# Altium schematic symbol library jlcpcb_2025_04_resistors_extended_1210.schlib: 2670 symbols (part 5 of 14)
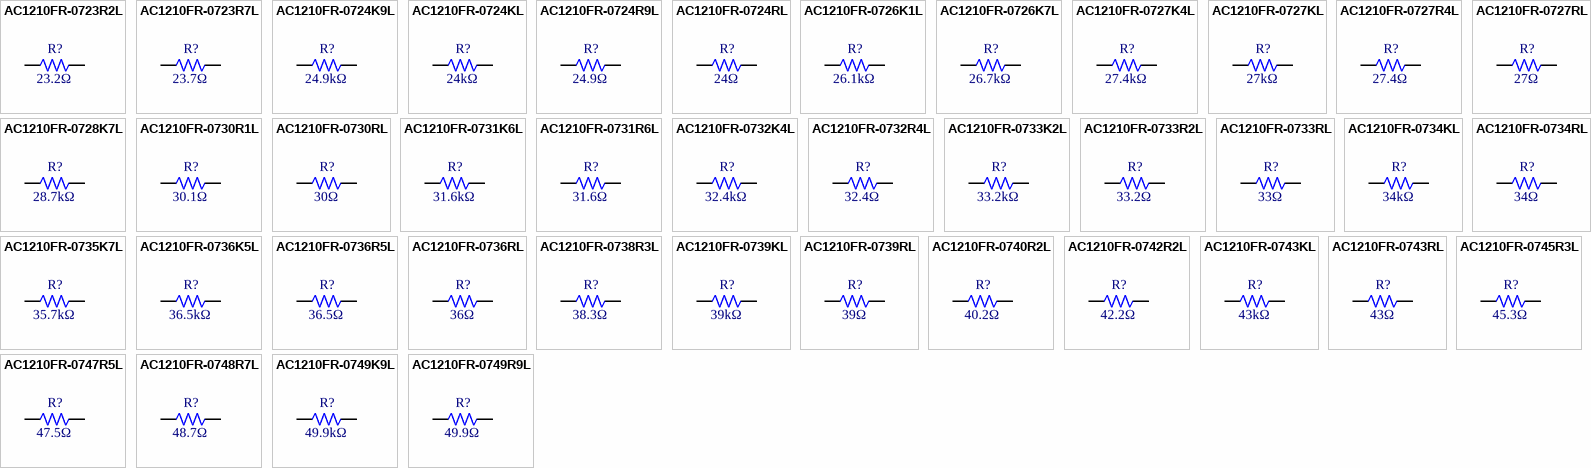
[diagram p70: symbols AC1210FR-0723R2L to AC1210FR-0749R9L]

## AC1210FR-0731K6L
designator R?  Resistance: 31.6kΩ  (hidden comment: *)
Resistor, 31.6kΩ, ±1%, 500mW, 200V, ±100ppm/℃, -55℃~+155℃, SMD 1210; Manufacturer: Uniroyal; Manufacturer Part Number: AC1210FR-0731K6L; Supplier 1: LCSC; Supplier Part Number 1: C230188; JLCPCB Part Number: C230188; Power Rating: 500mW; Category: Resistors; Package Size: 1210; JLCPCB Basic Part: Yes; Tolerance: ±1%; Voltage Rating: 200V; Temperature Coefficient: ±100ppm/℃; Temperature Rating: -55℃~+155℃; ComponentLink1Description: Datasheet; ComponentLink1URL: https://wmsc.lcsc.com/wmsc/upload/file/pdf/v2/lcsc/2304140030_YAGEO-AC1210FR-0731K6L_C230188.pdf; ComponentLink2Description: JLCPCB Part URL; ComponentLink2URL: https://jlcpcb.com/partdetail/C230188
pins: 1, 2
1 alternate drawing of the same symbol

## AC1210FR-0731R6L
designator R?  Resistance: 31.6Ω  (hidden comment: *)
Resistor, 31.6Ω, ±1%, 500mW, 200V, ±100ppm/℃, -55℃~+155℃, SMD 1210; Manufacturer: Uniroyal; Manufacturer Part Number: AC1210FR-0731R6L; Supplier 1: LCSC; Supplier Part Number 1: C230189; JLCPCB Part Number: C230189; Power Rating: 500mW; Category: Resistors; Package Size: 1210; JLCPCB Basic Part: Yes; Tolerance: ±1%; Voltage Rating: 200V; Temperature Coefficient: ±100ppm/℃; Temperature Rating: -55℃~+155℃; ComponentLink1Description: Datasheet; ComponentLink1URL: https://wmsc.lcsc.com/wmsc/upload/file/pdf/v2/lcsc/2304140030_YAGEO-AC1210FR-0731R6L_C230189.pdf; ComponentLink2Description: JLCPCB Part URL; ComponentLink2URL: https://jlcpcb.com/partdetail/C230189
pins: 1, 2
1 alternate drawing of the same symbol

## AC1210FR-0732K4L
designator R?  Resistance: 32.4kΩ  (hidden comment: *)
Resistor, 32.4kΩ, ±1%, 500mW, 200V, ±100ppm/℃, -55℃~+155℃, SMD 1210; Manufacturer: Uniroyal; Manufacturer Part Number: AC1210FR-0732K4L; Supplier 1: LCSC; Supplier Part Number 1: C230191; JLCPCB Part Number: C230191; Power Rating: 500mW; Category: Resistors; Package Size: 1210; JLCPCB Basic Part: Yes; Tolerance: ±1%; Voltage Rating: 200V; Temperature Coefficient: ±100ppm/℃; Temperature Rating: -55℃~+155℃; ComponentLink1Description: Datasheet; ComponentLink1URL: https://wmsc.lcsc.com/wmsc/upload/file/pdf/v2/lcsc/2304140030_YAGEO-AC1210FR-0732K4L_C230191.pdf; ComponentLink2Description: JLCPCB Part URL; ComponentLink2URL: https://jlcpcb.com/partdetail/C230191
pins: 1, 2
1 alternate drawing of the same symbol

## AC1210FR-0732R4L
designator R?  Resistance: 32.4Ω  (hidden comment: *)
Resistor, 32.4Ω, ±1%, 500mW, 200V, ±100ppm/℃, -55℃~+155℃, SMD 1210; Manufacturer: Uniroyal; Manufacturer Part Number: AC1210FR-0732R4L; Supplier 1: LCSC; Supplier Part Number 1: C728025; JLCPCB Part Number: C728025; Power Rating: 500mW; Category: Resistors; Package Size: 1210; JLCPCB Basic Part: Yes; Tolerance: ±1%; Voltage Rating: 200V; Temperature Coefficient: ±100ppm/℃; Temperature Rating: -55℃~+155℃; ComponentLink1Description: Datasheet; ComponentLink1URL: https://wmsc.lcsc.com/wmsc/upload/file/pdf/v2/lcsc/2304140030_YAGEO-AC1210FR-0732R4L_C728025.pdf; ComponentLink2Description: JLCPCB Part URL; ComponentLink2URL: https://jlcpcb.com/partdetail/C728025
pins: 1, 2
1 alternate drawing of the same symbol

## AC1210FR-0733K2L
designator R?  Resistance: 33.2kΩ  (hidden comment: *)
Resistor, 33.2kΩ, ±1%, 500mW, 200V, ±100ppm/℃, -55℃~+155℃, SMD 1210; Manufacturer: Uniroyal; Manufacturer Part Number: AC1210FR-0733K2L; Supplier 1: LCSC; Supplier Part Number 1: C230196; JLCPCB Part Number: C230196; Power Rating: 500mW; Category: Resistors; Package Size: 1210; JLCPCB Basic Part: Yes; Tolerance: ±1%; Voltage Rating: 200V; Temperature Coefficient: ±100ppm/℃; Temperature Rating: -55℃~+155℃; ComponentLink1Description: Datasheet; ComponentLink1URL: https://wmsc.lcsc.com/wmsc/upload/file/pdf/v2/lcsc/2304140030_YAGEO-AC1210FR-0733K2L_C230196.pdf; ComponentLink2Description: JLCPCB Part URL; ComponentLink2URL: https://jlcpcb.com/partdetail/C230196
pins: 1, 2
1 alternate drawing of the same symbol

## AC1210FR-0733R2L
designator R?  Resistance: 33.2Ω  (hidden comment: *)
Resistor, 33.2Ω, ±1%, 500mW, 200V, ±100ppm/℃, -55℃~+155℃, SMD 1210; Manufacturer: Uniroyal; Manufacturer Part Number: AC1210FR-0733R2L; Supplier 1: LCSC; Supplier Part Number 1: C910972; JLCPCB Part Number: C910972; Power Rating: 500mW; Category: Resistors; Package Size: 1210; JLCPCB Basic Part: Yes; Tolerance: ±1%; Voltage Rating: 200V; Temperature Coefficient: ±100ppm/℃; Temperature Rating: -55℃~+155℃; ComponentLink1Description: Datasheet; ComponentLink1URL: https://wmsc.lcsc.com/wmsc/upload/file/pdf/v2/lcsc/2201131300_YAGEO-AC1210FR-0733R2L_C910972.pdf; ComponentLink2Description: JLCPCB Part URL; ComponentLink2URL: https://jlcpcb.com/partdetail/C910972
pins: 1, 2
1 alternate drawing of the same symbol

## AC1210FR-0733RL
designator R?  Resistance: 33Ω  (hidden comment: *)
Resistor, 33Ω, ±1%, 500mW, 200V, ±100ppm/℃, -55℃~+155℃, SMD 1210; Manufacturer: Uniroyal; Manufacturer Part Number: AC1210FR-0733RL; Supplier 1: LCSC; Supplier Part Number 1: C230198; JLCPCB Part Number: C230198; Power Rating: 500mW; Category: Resistors; Package Size: 1210; JLCPCB Basic Part: Yes; Tolerance: ±1%; Voltage Rating: 200V; Temperature Coefficient: ±100ppm/℃; Temperature Rating: -55℃~+155℃; ComponentLink1Description: Datasheet; ComponentLink1URL: https://wmsc.lcsc.com/wmsc/upload/file/pdf/v2/lcsc/2304140030_YAGEO-AC1210FR-0733RL_C230198.pdf; ComponentLink2Description: JLCPCB Part URL; ComponentLink2URL: https://jlcpcb.com/partdetail/C230198
pins: 1, 2
1 alternate drawing of the same symbol

## AC1210FR-0734KL
designator R?  Resistance: 34kΩ  (hidden comment: *)
Resistor, 34kΩ, ±1%, 500mW, 200V, ±100ppm/℃, -55℃~+155℃, SMD 1210; Manufacturer: Uniroyal; Manufacturer Part Number: AC1210FR-0734KL; Supplier 1: LCSC; Supplier Part Number 1: C230202; JLCPCB Part Number: C230202; Power Rating: 500mW; Category: Resistors; Package Size: 1210; JLCPCB Basic Part: Yes; Tolerance: ±1%; Voltage Rating: 200V; Temperature Coefficient: ±100ppm/℃; Temperature Rating: -55℃~+155℃; ComponentLink1Description: Datasheet; ComponentLink1URL: https://wmsc.lcsc.com/wmsc/upload/file/pdf/v2/lcsc/2304140030_YAGEO-AC1210FR-0734KL_C230202.pdf; ComponentLink2Description: JLCPCB Part URL; ComponentLink2URL: https://jlcpcb.com/partdetail/C230202
pins: 1, 2
1 alternate drawing of the same symbol

## AC1210FR-0734RL
designator R?  Resistance: 34Ω  (hidden comment: *)
Resistor, 34Ω, ±1%, 500mW, 200V, ±100ppm/℃, -55℃~+155℃, SMD 1210; Manufacturer: Uniroyal; Manufacturer Part Number: AC1210FR-0734RL; Supplier 1: LCSC; Supplier Part Number 1: C230204; JLCPCB Part Number: C230204; Power Rating: 500mW; Category: Resistors; Package Size: 1210; JLCPCB Basic Part: Yes; Tolerance: ±1%; Voltage Rating: 200V; Temperature Coefficient: ±100ppm/℃; Temperature Rating: -55℃~+155℃; ComponentLink1Description: Datasheet; ComponentLink1URL: https://wmsc.lcsc.com/wmsc/upload/file/pdf/v2/lcsc/2304140030_YAGEO-AC1210FR-0734RL_C230204.pdf; ComponentLink2Description: JLCPCB Part URL; ComponentLink2URL: https://jlcpcb.com/partdetail/C230204
pins: 1, 2
1 alternate drawing of the same symbol

## AC1210FR-0735K7L
designator R?  Resistance: 35.7kΩ  (hidden comment: *)
Resistor, 35.7kΩ, ±1%, 500mW, 200V, ±100ppm/℃, -55℃~+155℃, SMD 1210; Manufacturer: Uniroyal; Manufacturer Part Number: AC1210FR-0735K7L; Supplier 1: LCSC; Supplier Part Number 1: C230206; JLCPCB Part Number: C230206; Power Rating: 500mW; Category: Resistors; Package Size: 1210; JLCPCB Basic Part: Yes; Tolerance: ±1%; Voltage Rating: 200V; Temperature Coefficient: ±100ppm/℃; Temperature Rating: -55℃~+155℃; ComponentLink1Description: Datasheet; ComponentLink1URL: https://wmsc.lcsc.com/wmsc/upload/file/pdf/v2/lcsc/2304140030_YAGEO-AC1210FR-0735K7L_C230206.pdf; ComponentLink2Description: JLCPCB Part URL; ComponentLink2URL: https://jlcpcb.com/partdetail/C230206
pins: 1, 2
1 alternate drawing of the same symbol

## AC1210FR-0736K5L
designator R?  Resistance: 36.5kΩ  (hidden comment: *)
Resistor, 36.5kΩ, ±1%, 500mW, 200V, ±100ppm/℃, -55℃~+155℃, SMD 1210; Manufacturer: Uniroyal; Manufacturer Part Number: AC1210FR-0736K5L; Supplier 1: LCSC; Supplier Part Number 1: C230211; JLCPCB Part Number: C230211; Power Rating: 500mW; Category: Resistors; Package Size: 1210; JLCPCB Basic Part: Yes; Tolerance: ±1%; Voltage Rating: 200V; Temperature Coefficient: ±100ppm/℃; Temperature Rating: -55℃~+155℃; ComponentLink1Description: Datasheet; ComponentLink1URL: https://wmsc.lcsc.com/wmsc/upload/file/pdf/v2/lcsc/2304140030_YAGEO-AC1210FR-0736K5L_C230211.pdf; ComponentLink2Description: JLCPCB Part URL; ComponentLink2URL: https://jlcpcb.com/partdetail/C230211
pins: 1, 2
1 alternate drawing of the same symbol

## AC1210FR-0736R5L
designator R?  Resistance: 36.5Ω  (hidden comment: *)
Resistor, 36.5Ω, ±1%, 500mW, ±100ppm/℃, -55℃~+155℃, SMD 1210; Manufacturer: Uniroyal; Manufacturer Part Number: AC1210FR-0736R5L; Supplier 1: LCSC; Supplier Part Number 1: C910973; JLCPCB Part Number: C910973; Power Rating: 500mW; Category: Resistors; Package Size: 1210; JLCPCB Basic Part: Yes; Tolerance: ±1%; Temperature Coefficient: ±100ppm/℃; Temperature Rating: -55℃~+155℃; ComponentLink1Description: Datasheet; ComponentLink1URL: https://wmsc.lcsc.com/wmsc/upload/file/pdf/v2/lcsc/2201131300_YAGEO-AC1210FR-0736R5L_C910973.pdf; ComponentLink2Description: JLCPCB Part URL; ComponentLink2URL: https://jlcpcb.com/partdetail/C910973
pins: 1, 2
1 alternate drawing of the same symbol

## AC1210FR-0736RL
designator R?  Resistance: 36Ω  (hidden comment: *)
Resistor, 36Ω, ±1%, 500mW, 200V, ±100ppm/℃, -55℃~+155℃, SMD 1210; Manufacturer: Uniroyal; Manufacturer Part Number: AC1210FR-0736RL; Supplier 1: LCSC; Supplier Part Number 1: C230213; JLCPCB Part Number: C230213; Power Rating: 500mW; Category: Resistors; Package Size: 1210; JLCPCB Basic Part: Yes; Tolerance: ±1%; Voltage Rating: 200V; Temperature Coefficient: ±100ppm/℃; Temperature Rating: -55℃~+155℃; ComponentLink1Description: Datasheet; ComponentLink1URL: https://wmsc.lcsc.com/wmsc/upload/file/pdf/v2/lcsc/2304140030_YAGEO-AC1210FR-0736RL_C230213.pdf; ComponentLink2Description: JLCPCB Part URL; ComponentLink2URL: https://jlcpcb.com/partdetail/C230213
pins: 1, 2
1 alternate drawing of the same symbol

## AC1210FR-0738R3L
designator R?  Resistance: 38.3Ω  (hidden comment: *)
Resistor, 38.3Ω, ±1%, 500mW, 200V, ±100ppm/℃, -55℃~+155℃, SMD 1210; Manufacturer: Uniroyal; Manufacturer Part Number: AC1210FR-0738R3L; Supplier 1: LCSC; Supplier Part Number 1: C230217; JLCPCB Part Number: C230217; Power Rating: 500mW; Category: Resistors; Package Size: 1210; JLCPCB Basic Part: Yes; Tolerance: ±1%; Voltage Rating: 200V; Temperature Coefficient: ±100ppm/℃; Temperature Rating: -55℃~+155℃; ComponentLink1Description: Datasheet; ComponentLink1URL: https://wmsc.lcsc.com/wmsc/upload/file/pdf/v2/lcsc/2304140030_YAGEO-AC1210FR-0738R3L_C230217.pdf; ComponentLink2Description: JLCPCB Part URL; ComponentLink2URL: https://jlcpcb.com/partdetail/C230217
pins: 1, 2
1 alternate drawing of the same symbol

## AC1210FR-0739KL
designator R?  Resistance: 39kΩ  (hidden comment: *)
Resistor, 39kΩ, ±1%, 500mW, 200V, ±100ppm/℃, -55℃~+155℃, SMD 1210; Manufacturer: Uniroyal; Manufacturer Part Number: AC1210FR-0739KL; Supplier 1: LCSC; Supplier Part Number 1: C230221; JLCPCB Part Number: C230221; Power Rating: 500mW; Category: Resistors; Package Size: 1210; JLCPCB Basic Part: Yes; Tolerance: ±1%; Voltage Rating: 200V; Temperature Coefficient: ±100ppm/℃; Temperature Rating: -55℃~+155℃; ComponentLink1Description: Datasheet; ComponentLink1URL: https://wmsc.lcsc.com/wmsc/upload/file/pdf/v2/lcsc/2304140030_YAGEO-AC1210FR-0739KL_C230221.pdf; ComponentLink2Description: JLCPCB Part URL; ComponentLink2URL: https://jlcpcb.com/partdetail/C230221
pins: 1, 2
1 alternate drawing of the same symbol

## AC1210FR-0739RL
designator R?  Resistance: 39Ω  (hidden comment: *)
Resistor, 39Ω, ±1%, 500mW, 200V, ±100ppm/℃, -55℃~+155℃, SMD 1210; Manufacturer: Uniroyal; Manufacturer Part Number: AC1210FR-0739RL; Supplier 1: LCSC; Supplier Part Number 1: C230223; JLCPCB Part Number: C230223; Power Rating: 500mW; Category: Resistors; Package Size: 1210; JLCPCB Basic Part: Yes; Tolerance: ±1%; Voltage Rating: 200V; Temperature Coefficient: ±100ppm/℃; Temperature Rating: -55℃~+155℃; ComponentLink1Description: Datasheet; ComponentLink1URL: https://wmsc.lcsc.com/wmsc/upload/file/pdf/v2/lcsc/2304140030_YAGEO-AC1210FR-0739RL_C230223.pdf; ComponentLink2Description: JLCPCB Part URL; ComponentLink2URL: https://jlcpcb.com/partdetail/C230223
pins: 1, 2
1 alternate drawing of the same symbol

## AC1210FR-0740R2L
designator R?  Resistance: 40.2Ω  (hidden comment: *)
Resistor, 40.2Ω, ±1%, 500mW, 200V, ±100ppm/℃, -55℃~+155℃, SMD 1210; Manufacturer: Uniroyal; Manufacturer Part Number: AC1210FR-0740R2L; Supplier 1: LCSC; Supplier Part Number 1: C230238; JLCPCB Part Number: C230238; Power Rating: 500mW; Category: Resistors; Package Size: 1210; JLCPCB Basic Part: Yes; Tolerance: ±1%; Voltage Rating: 200V; Temperature Coefficient: ±100ppm/℃; Temperature Rating: -55℃~+155℃; ComponentLink1Description: Datasheet; ComponentLink1URL: https://wmsc.lcsc.com/wmsc/upload/file/pdf/v2/lcsc/2304140030_YAGEO-AC1210FR-0740R2L_C230238.pdf; ComponentLink2Description: JLCPCB Part URL; ComponentLink2URL: https://jlcpcb.com/partdetail/C230238
pins: 1, 2
1 alternate drawing of the same symbol

## AC1210FR-0742R2L
designator R?  Resistance: 42.2Ω  (hidden comment: *)
Resistor, 42.2Ω, ±1%, 500mW, 200V, ±100ppm/℃, -55℃~+155℃, SMD 1210; Manufacturer: Uniroyal; Manufacturer Part Number: AC1210FR-0742R2L; Supplier 1: LCSC; Supplier Part Number 1: C230241; JLCPCB Part Number: C230241; Power Rating: 500mW; Category: Resistors; Package Size: 1210; JLCPCB Basic Part: Yes; Tolerance: ±1%; Voltage Rating: 200V; Temperature Coefficient: ±100ppm/℃; Temperature Rating: -55℃~+155℃; ComponentLink1Description: Datasheet; ComponentLink1URL: https://wmsc.lcsc.com/wmsc/upload/file/pdf/v2/lcsc/2304140030_YAGEO-AC1210FR-0742R2L_C230241.pdf; ComponentLink2Description: JLCPCB Part URL; ComponentLink2URL: https://jlcpcb.com/partdetail/C230241
pins: 1, 2
1 alternate drawing of the same symbol

## AC1210FR-0743KL
designator R?  Resistance: 43kΩ  (hidden comment: *)
Resistor, 43kΩ, ±1%, 500mW, 200V, ±100ppm/℃, -55℃~+155℃, SMD 1210; Manufacturer: Uniroyal; Manufacturer Part Number: AC1210FR-0743KL; Supplier 1: LCSC; Supplier Part Number 1: C230244; JLCPCB Part Number: C230244; Power Rating: 500mW; Category: Resistors; Package Size: 1210; JLCPCB Basic Part: Yes; Tolerance: ±1%; Voltage Rating: 200V; Temperature Coefficient: ±100ppm/℃; Temperature Rating: -55℃~+155℃; ComponentLink1Description: Datasheet; ComponentLink1URL: https://wmsc.lcsc.com/wmsc/upload/file/pdf/v2/lcsc/2304140030_YAGEO-AC1210FR-0743KL_C230244.pdf; ComponentLink2Description: JLCPCB Part URL; ComponentLink2URL: https://jlcpcb.com/partdetail/C230244
pins: 1, 2
1 alternate drawing of the same symbol

## AC1210FR-0743RL
designator R?  Resistance: 43Ω  (hidden comment: *)
Resistor, 43Ω, ±1%, 500mW, 200V, ±100ppm/℃, -55℃~+155℃, SMD 1210; Manufacturer: Uniroyal; Manufacturer Part Number: AC1210FR-0743RL; Supplier 1: LCSC; Supplier Part Number 1: C230246; JLCPCB Part Number: C230246; Power Rating: 500mW; Category: Resistors; Package Size: 1210; JLCPCB Basic Part: Yes; Tolerance: ±1%; Voltage Rating: 200V; Temperature Coefficient: ±100ppm/℃; Temperature Rating: -55℃~+155℃; ComponentLink1Description: Datasheet; ComponentLink1URL: https://wmsc.lcsc.com/wmsc/upload/file/pdf/v2/lcsc/2304140030_YAGEO-AC1210FR-0743RL_C230246.pdf; ComponentLink2Description: JLCPCB Part URL; ComponentLink2URL: https://jlcpcb.com/partdetail/C230246
pins: 1, 2
1 alternate drawing of the same symbol

## AC1210FR-0745R3L
designator R?  Resistance: 45.3Ω  (hidden comment: *)
Resistor, 45.3Ω, ±1%, 500mW, 200V, ±100ppm/℃, -55℃~+155℃, SMD 1210; Manufacturer: Uniroyal; Manufacturer Part Number: AC1210FR-0745R3L; Supplier 1: LCSC; Supplier Part Number 1: C230250; JLCPCB Part Number: C230250; Power Rating: 500mW; Category: Resistors; Package Size: 1210; JLCPCB Basic Part: Yes; Tolerance: ±1%; Voltage Rating: 200V; Temperature Coefficient: ±100ppm/℃; Temperature Rating: -55℃~+155℃; ComponentLink1Description: Datasheet; ComponentLink1URL: https://wmsc.lcsc.com/wmsc/upload/file/pdf/v2/lcsc/2304140030_YAGEO-AC1210FR-0745R3L_C230250.pdf; ComponentLink2Description: JLCPCB Part URL; ComponentLink2URL: https://jlcpcb.com/partdetail/C230250
pins: 1, 2
1 alternate drawing of the same symbol

## AC1210FR-0747R5L
designator R?  Resistance: 47.5Ω  (hidden comment: *)
Resistor, 47.5Ω, ±1%, 500mW, 200V, ±100ppm/℃, -55℃~+155℃, SMD 1210; Manufacturer: Uniroyal; Manufacturer Part Number: AC1210FR-0747R5L; Supplier 1: LCSC; Supplier Part Number 1: C230256; JLCPCB Part Number: C230256; Power Rating: 500mW; Category: Resistors; Package Size: 1210; JLCPCB Basic Part: Yes; Tolerance: ±1%; Voltage Rating: 200V; Temperature Coefficient: ±100ppm/℃; Temperature Rating: -55℃~+155℃; ComponentLink1Description: Datasheet; ComponentLink1URL: https://wmsc.lcsc.com/wmsc/upload/file/pdf/v2/lcsc/2304140030_YAGEO-AC1210FR-0747R5L_C230256.pdf; ComponentLink2Description: JLCPCB Part URL; ComponentLink2URL: https://jlcpcb.com/partdetail/C230256
pins: 1, 2
1 alternate drawing of the same symbol

## AC1210FR-0748R7L
designator R?  Resistance: 48.7Ω  (hidden comment: *)
Resistor, 48.7Ω, ±1%, 500mW, 200V, ±100ppm/℃, -55℃~+155℃, SMD 1210; Manufacturer: Uniroyal; Manufacturer Part Number: AC1210FR-0748R7L; Supplier 1: LCSC; Supplier Part Number 1: C910976; JLCPCB Part Number: C910976; Power Rating: 500mW; Category: Resistors; Package Size: 1210; JLCPCB Basic Part: Yes; Tolerance: ±1%; Voltage Rating: 200V; Temperature Coefficient: ±100ppm/℃; Temperature Rating: -55℃~+155℃; ComponentLink1Description: Datasheet; ComponentLink1URL: https://wmsc.lcsc.com/wmsc/upload/file/pdf/v2/lcsc/2201131300_YAGEO-AC1210FR-0748R7L_C910976.pdf; ComponentLink2Description: JLCPCB Part URL; ComponentLink2URL: https://jlcpcb.com/partdetail/C910976
pins: 1, 2
1 alternate drawing of the same symbol

## AC1210FR-0749K9L
designator R?  Resistance: 49.9kΩ  (hidden comment: *)
Resistor, 49.9kΩ, ±1%, 500mW, 200V, ±100ppm/℃, -55℃~+155℃, SMD 1210; Manufacturer: Uniroyal; Manufacturer Part Number: AC1210FR-0749K9L; Supplier 1: LCSC; Supplier Part Number 1: C230260; JLCPCB Part Number: C230260; Power Rating: 500mW; Category: Resistors; Package Size: 1210; JLCPCB Basic Part: Yes; Tolerance: ±1%; Voltage Rating: 200V; Temperature Coefficient: ±100ppm/℃; Temperature Rating: -55℃~+155℃; ComponentLink1Description: Datasheet; ComponentLink1URL: https://wmsc.lcsc.com/wmsc/upload/file/pdf/v2/lcsc/2304140030_YAGEO-AC1210FR-0749K9L_C230260.pdf; ComponentLink2Description: JLCPCB Part URL; ComponentLink2URL: https://jlcpcb.com/partdetail/C230260
pins: 1, 2
1 alternate drawing of the same symbol

## AC1210FR-0749R9L
designator R?  Resistance: 49.9Ω  (hidden comment: *)
Resistor, 49.9Ω, ±1%, 500mW, 200V, ±100ppm/℃, -55℃~+155℃, SMD 1210; Manufacturer: Uniroyal; Manufacturer Part Number: AC1210FR-0749R9L; Supplier 1: LCSC; Supplier Part Number 1: C230261; JLCPCB Part Number: C230261; Power Rating: 500mW; Category: Resistors; Package Size: 1210; JLCPCB Basic Part: Yes; Tolerance: ±1%; Voltage Rating: 200V; Temperature Coefficient: ±100ppm/℃; Temperature Rating: -55℃~+155℃; ComponentLink1Description: Datasheet; ComponentLink1URL: https://wmsc.lcsc.com/wmsc/upload/file/pdf/v2/lcsc/2304140030_YAGEO-AC1210FR-0749R9L_C230261.pdf; ComponentLink2Description: JLCPCB Part URL; ComponentLink2URL: https://jlcpcb.com/partdetail/C230261
pins: 1, 2
1 alternate drawing of the same symbol

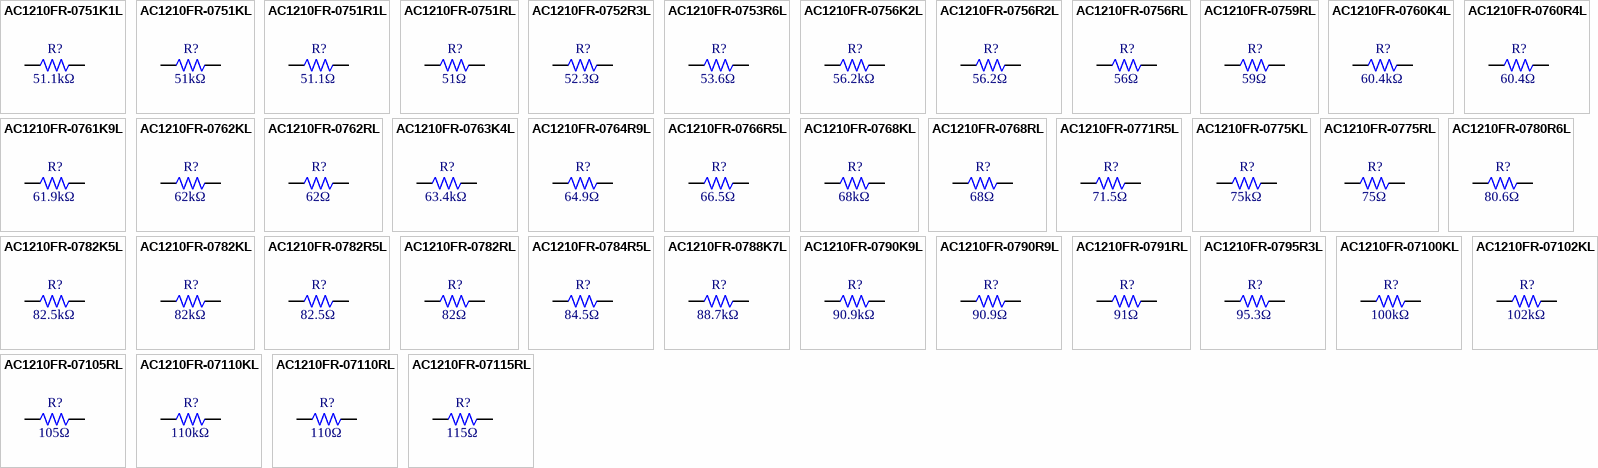
[diagram p20: symbols AC1210FR-0751K1L to AC1210FR-07115RL]

## AC1210FR-0751K1L
designator R?  Resistance: 51.1kΩ  (hidden comment: *)
Resistor, 51.1kΩ, ±1%, 500mW, 200V, ±100ppm/℃, -55℃~+155℃, SMD 1210; Manufacturer: Uniroyal; Manufacturer Part Number: AC1210FR-0751K1L; Supplier 1: LCSC; Supplier Part Number 1: C230279; JLCPCB Part Number: C230279; Power Rating: 500mW; Category: Resistors; Package Size: 1210; JLCPCB Basic Part: Yes; Tolerance: ±1%; Voltage Rating: 200V; Temperature Coefficient: ±100ppm/℃; Temperature Rating: -55℃~+155℃; ComponentLink1Description: Datasheet; ComponentLink1URL: https://wmsc.lcsc.com/wmsc/upload/file/pdf/v2/lcsc/2304140030_YAGEO-AC1210FR-0751K1L_C230279.pdf; ComponentLink2Description: JLCPCB Part URL; ComponentLink2URL: https://jlcpcb.com/partdetail/C230279
pins: 1, 2
1 alternate drawing of the same symbol

## AC1210FR-0751KL
designator R?  Resistance: 51kΩ  (hidden comment: *)
Resistor, 51kΩ, ±1%, 500mW, 200V, ±100ppm/℃, -55℃~+155℃, SMD 1210; Manufacturer: Uniroyal; Manufacturer Part Number: AC1210FR-0751KL; Supplier 1: LCSC; Supplier Part Number 1: C230280; JLCPCB Part Number: C230280; Power Rating: 500mW; Category: Resistors; Package Size: 1210; JLCPCB Basic Part: Yes; Tolerance: ±1%; Voltage Rating: 200V; Temperature Coefficient: ±100ppm/℃; Temperature Rating: -55℃~+155℃; ComponentLink1Description: Datasheet; ComponentLink1URL: https://wmsc.lcsc.com/wmsc/upload/file/pdf/v2/lcsc/2304140030_YAGEO-AC1210FR-0751KL_C230280.pdf; ComponentLink2Description: JLCPCB Part URL; ComponentLink2URL: https://jlcpcb.com/partdetail/C230280
pins: 1, 2
1 alternate drawing of the same symbol

## AC1210FR-0751R1L
designator R?  Resistance: 51.1Ω  (hidden comment: *)
Resistor, 51.1Ω, ±1%, 500mW, 200V, ±100ppm/℃, -55℃~+155℃, SMD 1210; Manufacturer: Uniroyal; Manufacturer Part Number: AC1210FR-0751R1L; Supplier 1: LCSC; Supplier Part Number 1: C910157; JLCPCB Part Number: C910157; Power Rating: 500mW; Category: Resistors; Package Size: 1210; JLCPCB Basic Part: Yes; Tolerance: ±1%; Voltage Rating: 200V; Temperature Coefficient: ±100ppm/℃; Temperature Rating: -55℃~+155℃; ComponentLink1Description: Datasheet; ComponentLink1URL: https://wmsc.lcsc.com/wmsc/upload/file/pdf/v2/lcsc/2201242100_YAGEO-AC1210FR-0751R1L_C910157.pdf; ComponentLink2Description: JLCPCB Part URL; ComponentLink2URL: https://jlcpcb.com/partdetail/C910157
pins: 1, 2
1 alternate drawing of the same symbol

## AC1210FR-0751RL
designator R?  Resistance: 51Ω  (hidden comment: *)
Resistor, 51Ω, ±1%, 500mW, 200V, ±100ppm/℃, -55℃~+155℃, SMD 1210; Manufacturer: Uniroyal; Manufacturer Part Number: AC1210FR-0751RL; Supplier 1: LCSC; Supplier Part Number 1: C230281; JLCPCB Part Number: C230281; Power Rating: 500mW; Category: Resistors; Package Size: 1210; JLCPCB Basic Part: Yes; Tolerance: ±1%; Voltage Rating: 200V; Temperature Coefficient: ±100ppm/℃; Temperature Rating: -55℃~+155℃; ComponentLink1Description: Datasheet; ComponentLink1URL: https://wmsc.lcsc.com/wmsc/upload/file/pdf/v2/lcsc/2304140030_YAGEO-AC1210FR-0751RL_C230281.pdf; ComponentLink2Description: JLCPCB Part URL; ComponentLink2URL: https://jlcpcb.com/partdetail/C230281
pins: 1, 2
1 alternate drawing of the same symbol

## AC1210FR-0752R3L
designator R?  Resistance: 52.3Ω  (hidden comment: *)
Resistor, 52.3Ω, ±1%, 500mW, 200V, ±100ppm/℃, -55℃~+155℃, SMD 1210; Manufacturer: Uniroyal; Manufacturer Part Number: AC1210FR-0752R3L; Supplier 1: LCSC; Supplier Part Number 1: C230282; JLCPCB Part Number: C230282; Power Rating: 500mW; Category: Resistors; Package Size: 1210; JLCPCB Basic Part: Yes; Tolerance: ±1%; Voltage Rating: 200V; Temperature Coefficient: ±100ppm/℃; Temperature Rating: -55℃~+155℃; ComponentLink1Description: Datasheet; ComponentLink1URL: https://wmsc.lcsc.com/wmsc/upload/file/pdf/v2/lcsc/2304140030_YAGEO-AC1210FR-0752R3L_C230282.pdf; ComponentLink2Description: JLCPCB Part URL; ComponentLink2URL: https://jlcpcb.com/partdetail/C230282
pins: 1, 2
1 alternate drawing of the same symbol

## AC1210FR-0753R6L
designator R?  Resistance: 53.6Ω  (hidden comment: *)
Resistor, 53.6Ω, ±1%, 500mW, 200V, ±100ppm/℃, -55℃~+155℃, SMD 1210; Manufacturer: Uniroyal; Manufacturer Part Number: AC1210FR-0753R6L; Supplier 1: LCSC; Supplier Part Number 1: C230284; JLCPCB Part Number: C230284; Power Rating: 500mW; Category: Resistors; Package Size: 1210; JLCPCB Basic Part: Yes; Tolerance: ±1%; Voltage Rating: 200V; Temperature Coefficient: ±100ppm/℃; Temperature Rating: -55℃~+155℃; ComponentLink1Description: Datasheet; ComponentLink1URL: https://wmsc.lcsc.com/wmsc/upload/file/pdf/v2/lcsc/2304140030_YAGEO-AC1210FR-0753R6L_C230284.pdf; ComponentLink2Description: JLCPCB Part URL; ComponentLink2URL: https://jlcpcb.com/partdetail/C230284
pins: 1, 2
1 alternate drawing of the same symbol

## AC1210FR-0756K2L
designator R?  Resistance: 56.2kΩ  (hidden comment: *)
Resistor, 56.2kΩ, ±1%, 500mW, 200V, ±100ppm/℃, -55℃~+155℃, SMD 1210; Manufacturer: Uniroyal; Manufacturer Part Number: AC1210FR-0756K2L; Supplier 1: LCSC; Supplier Part Number 1: C230289; JLCPCB Part Number: C230289; Power Rating: 500mW; Category: Resistors; Package Size: 1210; JLCPCB Basic Part: Yes; Tolerance: ±1%; Voltage Rating: 200V; Temperature Coefficient: ±100ppm/℃; Temperature Rating: -55℃~+155℃; ComponentLink1Description: Datasheet; ComponentLink1URL: https://wmsc.lcsc.com/wmsc/upload/file/pdf/v2/lcsc/2304140030_YAGEO-AC1210FR-0756K2L_C230289.pdf; ComponentLink2Description: JLCPCB Part URL; ComponentLink2URL: https://jlcpcb.com/partdetail/C230289
pins: 1, 2
1 alternate drawing of the same symbol

## AC1210FR-0756R2L
designator R?  Resistance: 56.2Ω  (hidden comment: *)
Resistor, 56.2Ω, ±1%, 500mW, 200V, ±100ppm/℃, -55℃~+155℃, SMD 1210; Manufacturer: Uniroyal; Manufacturer Part Number: AC1210FR-0756R2L; Supplier 1: LCSC; Supplier Part Number 1: C230291; JLCPCB Part Number: C230291; Power Rating: 500mW; Category: Resistors; Package Size: 1210; JLCPCB Basic Part: Yes; Tolerance: ±1%; Voltage Rating: 200V; Temperature Coefficient: ±100ppm/℃; Temperature Rating: -55℃~+155℃; ComponentLink1Description: Datasheet; ComponentLink1URL: https://wmsc.lcsc.com/wmsc/upload/file/pdf/v2/lcsc/2304140030_YAGEO-AC1210FR-0756R2L_C230291.pdf; ComponentLink2Description: JLCPCB Part URL; ComponentLink2URL: https://jlcpcb.com/partdetail/C230291
pins: 1, 2
1 alternate drawing of the same symbol

## AC1210FR-0756RL
designator R?  Resistance: 56Ω  (hidden comment: *)
Resistor, 56Ω, ±1%, 500mW, 200V, ±100ppm/℃, -55℃~+155℃, SMD 1210; Manufacturer: Uniroyal; Manufacturer Part Number: AC1210FR-0756RL; Supplier 1: LCSC; Supplier Part Number 1: C230292; JLCPCB Part Number: C230292; Power Rating: 500mW; Category: Resistors; Package Size: 1210; JLCPCB Basic Part: Yes; Tolerance: ±1%; Voltage Rating: 200V; Temperature Coefficient: ±100ppm/℃; Temperature Rating: -55℃~+155℃; ComponentLink1Description: Datasheet; ComponentLink1URL: https://wmsc.lcsc.com/wmsc/upload/file/pdf/v2/lcsc/2304140030_YAGEO-AC1210FR-0756RL_C230292.pdf; ComponentLink2Description: JLCPCB Part URL; ComponentLink2URL: https://jlcpcb.com/partdetail/C230292
pins: 1, 2
1 alternate drawing of the same symbol

## AC1210FR-0759RL
designator R?  Resistance: 59Ω  (hidden comment: *)
Resistor, 59Ω, ±1%, 500mW, 200V, ±100ppm/℃, -55℃~+155℃, SMD 1210; Manufacturer: Uniroyal; Manufacturer Part Number: AC1210FR-0759RL; Supplier 1: LCSC; Supplier Part Number 1: C230294; JLCPCB Part Number: C230294; Power Rating: 500mW; Category: Resistors; Package Size: 1210; JLCPCB Basic Part: Yes; Tolerance: ±1%; Voltage Rating: 200V; Temperature Coefficient: ±100ppm/℃; Temperature Rating: -55℃~+155℃; ComponentLink1Description: Datasheet; ComponentLink1URL: https://wmsc.lcsc.com/wmsc/upload/file/pdf/v2/lcsc/2304140030_YAGEO-AC1210FR-0759RL_C230294.pdf; ComponentLink2Description: JLCPCB Part URL; ComponentLink2URL: https://jlcpcb.com/partdetail/C230294
pins: 1, 2
1 alternate drawing of the same symbol

## AC1210FR-0760K4L
designator R?  Resistance: 60.4kΩ  (hidden comment: *)
Resistor, 60.4kΩ, ±1%, 500mW, 200V, ±100ppm/℃, -55℃~+155℃, SMD 1210; Manufacturer: Uniroyal; Manufacturer Part Number: AC1210FR-0760K4L; Supplier 1: LCSC; Supplier Part Number 1: C230305; JLCPCB Part Number: C230305; Power Rating: 500mW; Category: Resistors; Package Size: 1210; JLCPCB Basic Part: Yes; Tolerance: ±1%; Voltage Rating: 200V; Temperature Coefficient: ±100ppm/℃; Temperature Rating: -55℃~+155℃; ComponentLink1Description: Datasheet; ComponentLink1URL: https://wmsc.lcsc.com/wmsc/upload/file/pdf/v2/lcsc/2304140030_YAGEO-AC1210FR-0760K4L_C230305.pdf; ComponentLink2Description: JLCPCB Part URL; ComponentLink2URL: https://jlcpcb.com/partdetail/C230305
pins: 1, 2
1 alternate drawing of the same symbol

## AC1210FR-0760R4L
designator R?  Resistance: 60.4Ω  (hidden comment: *)
Resistor, 60.4Ω, ±1%, 500mW, 200V, ±100ppm/℃, -55℃~+155℃, SMD 1210; Manufacturer: Uniroyal; Manufacturer Part Number: AC1210FR-0760R4L; Supplier 1: LCSC; Supplier Part Number 1: C230306; JLCPCB Part Number: C230306; Power Rating: 500mW; Category: Resistors; Package Size: 1210; JLCPCB Basic Part: Yes; Tolerance: ±1%; Voltage Rating: 200V; Temperature Coefficient: ±100ppm/℃; Temperature Rating: -55℃~+155℃; ComponentLink1Description: Datasheet; ComponentLink1URL: https://wmsc.lcsc.com/wmsc/upload/file/pdf/v2/lcsc/1912111437_YAGEO-AC1210FR-0760R4L_C230306.pdf; ComponentLink2Description: JLCPCB Part URL; ComponentLink2URL: https://jlcpcb.com/partdetail/C230306
pins: 1, 2
1 alternate drawing of the same symbol

## AC1210FR-0761K9L
designator R?  Resistance: 61.9kΩ  (hidden comment: *)
Resistor, 61.9kΩ, ±1%, 500mW, 200V, ±100ppm/℃, -55℃~+155℃, SMD 1210; Manufacturer: Uniroyal; Manufacturer Part Number: AC1210FR-0761K9L; Supplier 1: LCSC; Supplier Part Number 1: C230308; JLCPCB Part Number: C230308; Power Rating: 500mW; Category: Resistors; Package Size: 1210; JLCPCB Basic Part: Yes; Tolerance: ±1%; Voltage Rating: 200V; Temperature Coefficient: ±100ppm/℃; Temperature Rating: -55℃~+155℃; ComponentLink1Description: Datasheet; ComponentLink1URL: https://wmsc.lcsc.com/wmsc/upload/file/pdf/v2/lcsc/2304140030_YAGEO-AC1210FR-0761K9L_C230308.pdf; ComponentLink2Description: JLCPCB Part URL; ComponentLink2URL: https://jlcpcb.com/partdetail/C230308
pins: 1, 2
1 alternate drawing of the same symbol

## AC1210FR-0762KL
designator R?  Resistance: 62kΩ  (hidden comment: *)
Resistor, 62kΩ, ±1%, 500mW, 200V, ±100ppm/℃, -55℃~+155℃, SMD 1210; Manufacturer: Uniroyal; Manufacturer Part Number: AC1210FR-0762KL; Supplier 1: LCSC; Supplier Part Number 1: C230312; JLCPCB Part Number: C230312; Power Rating: 500mW; Category: Resistors; Package Size: 1210; JLCPCB Basic Part: Yes; Tolerance: ±1%; Voltage Rating: 200V; Temperature Coefficient: ±100ppm/℃; Temperature Rating: -55℃~+155℃; ComponentLink1Description: Datasheet; ComponentLink1URL: https://wmsc.lcsc.com/wmsc/upload/file/pdf/v2/lcsc/2304140030_YAGEO-AC1210FR-0762KL_C230312.pdf; ComponentLink2Description: JLCPCB Part URL; ComponentLink2URL: https://jlcpcb.com/partdetail/C230312
pins: 1, 2
1 alternate drawing of the same symbol

## AC1210FR-0762RL
designator R?  Resistance: 62Ω  (hidden comment: *)
Resistor, 62Ω, ±1%, 500mW, 200V, ±100ppm/℃, -55℃~+155℃, SMD 1210; Manufacturer: Uniroyal; Manufacturer Part Number: AC1210FR-0762RL; Supplier 1: LCSC; Supplier Part Number 1: C230313; JLCPCB Part Number: C230313; Power Rating: 500mW; Category: Resistors; Package Size: 1210; JLCPCB Basic Part: Yes; Tolerance: ±1%; Voltage Rating: 200V; Temperature Coefficient: ±100ppm/℃; Temperature Rating: -55℃~+155℃; ComponentLink1Description: Datasheet; ComponentLink1URL: https://wmsc.lcsc.com/wmsc/upload/file/pdf/v2/lcsc/2304140030_YAGEO-AC1210FR-0762RL_C230313.pdf; ComponentLink2Description: JLCPCB Part URL; ComponentLink2URL: https://jlcpcb.com/partdetail/C230313
pins: 1, 2
1 alternate drawing of the same symbol

## AC1210FR-0763K4L
designator R?  Resistance: 63.4kΩ  (hidden comment: *)
Resistor, 63.4kΩ, ±1%, 500mW, 200V, ±100ppm/℃, -55℃~+155℃, SMD 1210; Manufacturer: Uniroyal; Manufacturer Part Number: AC1210FR-0763K4L; Supplier 1: LCSC; Supplier Part Number 1: C230315; JLCPCB Part Number: C230315; Power Rating: 500mW; Category: Resistors; Package Size: 1210; JLCPCB Basic Part: Yes; Tolerance: ±1%; Voltage Rating: 200V; Temperature Coefficient: ±100ppm/℃; Temperature Rating: -55℃~+155℃; ComponentLink1Description: Datasheet; ComponentLink1URL: https://wmsc.lcsc.com/wmsc/upload/file/pdf/v2/lcsc/2304140030_YAGEO-AC1210FR-0763K4L_C230315.pdf; ComponentLink2Description: JLCPCB Part URL; ComponentLink2URL: https://jlcpcb.com/partdetail/C230315
pins: 1, 2
1 alternate drawing of the same symbol

## AC1210FR-0764R9L
designator R?  Resistance: 64.9Ω  (hidden comment: *)
Resistor, 64.9Ω, ±1%, 500mW, 200V, ±100ppm/℃, -55℃~+155℃, SMD 1210; Manufacturer: Uniroyal; Manufacturer Part Number: AC1210FR-0764R9L; Supplier 1: LCSC; Supplier Part Number 1: C230318; JLCPCB Part Number: C230318; Power Rating: 500mW; Category: Resistors; Package Size: 1210; JLCPCB Basic Part: Yes; Tolerance: ±1%; Voltage Rating: 200V; Temperature Coefficient: ±100ppm/℃; Temperature Rating: -55℃~+155℃; ComponentLink1Description: Datasheet; ComponentLink1URL: https://wmsc.lcsc.com/wmsc/upload/file/pdf/v2/lcsc/2304140030_YAGEO-AC1210FR-0764R9L_C230318.pdf; ComponentLink2Description: JLCPCB Part URL; ComponentLink2URL: https://jlcpcb.com/partdetail/C230318
pins: 1, 2
1 alternate drawing of the same symbol

## AC1210FR-0766R5L
designator R?  Resistance: 66.5Ω  (hidden comment: *)
Resistor, 66.5Ω, ±1%, 500mW, 200V, ±100ppm/℃, -55℃~+155℃, SMD 1210; Manufacturer: Uniroyal; Manufacturer Part Number: AC1210FR-0766R5L; Supplier 1: LCSC; Supplier Part Number 1: C230320; JLCPCB Part Number: C230320; Power Rating: 500mW; Category: Resistors; Package Size: 1210; JLCPCB Basic Part: Yes; Tolerance: ±1%; Voltage Rating: 200V; Temperature Coefficient: ±100ppm/℃; Temperature Rating: -55℃~+155℃; ComponentLink1Description: Datasheet; ComponentLink1URL: https://wmsc.lcsc.com/wmsc/upload/file/pdf/v2/lcsc/2304140030_YAGEO-AC1210FR-0766R5L_C230320.pdf; ComponentLink2Description: JLCPCB Part URL; ComponentLink2URL: https://jlcpcb.com/partdetail/C230320
pins: 1, 2
1 alternate drawing of the same symbol

## AC1210FR-0768KL
designator R?  Resistance: 68kΩ  (hidden comment: *)
Resistor, 68kΩ, ±1%, 500mW, 200V, ±100ppm/℃, -55℃~+155℃, SMD 1210; Manufacturer: Uniroyal; Manufacturer Part Number: AC1210FR-0768KL; Supplier 1: LCSC; Supplier Part Number 1: C230325; JLCPCB Part Number: C230325; Power Rating: 500mW; Category: Resistors; Package Size: 1210; JLCPCB Basic Part: Yes; Tolerance: ±1%; Voltage Rating: 200V; Temperature Coefficient: ±100ppm/℃; Temperature Rating: -55℃~+155℃; ComponentLink1Description: Datasheet; ComponentLink1URL: https://wmsc.lcsc.com/wmsc/upload/file/pdf/v2/lcsc/2304140030_YAGEO-AC1210FR-0768KL_C230325.pdf; ComponentLink2Description: JLCPCB Part URL; ComponentLink2URL: https://jlcpcb.com/partdetail/C230325
pins: 1, 2
1 alternate drawing of the same symbol

## AC1210FR-0768RL
designator R?  Resistance: 68Ω  (hidden comment: *)
Resistor, 68Ω, ±1%, 500mW, 200V, ±100ppm/℃, -55℃~+155℃, SMD 1210; Manufacturer: Uniroyal; Manufacturer Part Number: AC1210FR-0768RL; Supplier 1: LCSC; Supplier Part Number 1: C230326; JLCPCB Part Number: C230326; Power Rating: 500mW; Category: Resistors; Package Size: 1210; JLCPCB Basic Part: Yes; Tolerance: ±1%; Voltage Rating: 200V; Temperature Coefficient: ±100ppm/℃; Temperature Rating: -55℃~+155℃; ComponentLink1Description: Datasheet; ComponentLink1URL: https://wmsc.lcsc.com/wmsc/upload/file/pdf/v2/lcsc/2304140030_YAGEO-AC1210FR-0768RL_C230326.pdf; ComponentLink2Description: JLCPCB Part URL; ComponentLink2URL: https://jlcpcb.com/partdetail/C230326
pins: 1, 2
1 alternate drawing of the same symbol

## AC1210FR-0771R5L
designator R?  Resistance: 71.5Ω  (hidden comment: *)
Resistor, 71.5Ω, ±1%, 500mW, 200V, ±100ppm/℃, -55℃~+155℃, SMD 1210; Manufacturer: Uniroyal; Manufacturer Part Number: AC1210FR-0771R5L; Supplier 1: LCSC; Supplier Part Number 1: C230337; JLCPCB Part Number: C230337; Power Rating: 500mW; Category: Resistors; Package Size: 1210; JLCPCB Basic Part: Yes; Tolerance: ±1%; Voltage Rating: 200V; Temperature Coefficient: ±100ppm/℃; Temperature Rating: -55℃~+155℃; ComponentLink1Description: Datasheet; ComponentLink1URL: https://wmsc.lcsc.com/wmsc/upload/file/pdf/v2/lcsc/2304140030_YAGEO-AC1210FR-0771R5L_C230337.pdf; ComponentLink2Description: JLCPCB Part URL; ComponentLink2URL: https://jlcpcb.com/partdetail/C230337
pins: 1, 2
1 alternate drawing of the same symbol
